# Altium schematic symbol library jlcpcb_2025_04_resistors_extended_0201.schlib: 1508 symbols (part 3 of 8) (continued)
## CR0201JH0474G
designator R?  Resistance: 470kΩ  (hidden comment: *)
Resistor, 470kΩ, ±5%, 50mW, 25V, SMD 0201; Manufacturer: Uniroyal; Manufacturer Part Number: CR0201JH0474G; Supplier 1: LCSC; Supplier Part Number 1: C3037237; JLCPCB Part Number: C3037237; Power Rating: 50mW; Category: Resistors; Package Size: 0201; JLCPCB Basic Part: Yes; Tolerance: ±5%; Voltage Rating: 25V; ComponentLink1Description: Datasheet; ComponentLink1URL: https://wmsc.lcsc.com/wmsc/upload/file/pdf/v2/lcsc/2207051802_LIZ-Elec-CR0201JH0474G_C3037237.pdf; ComponentLink2Description: JLCPCB Part URL; ComponentLink2URL: https://jlcpcb.com/partdetail/C3037237
pins: 1, 2
1 alternate drawing of the same symbol

## CRCW02011K00FNED
designator R?  Resistance: 1kΩ  (hidden comment: *)
Resistor, 1kΩ, ±1%, 50mW, ±200ppm/℃, -55℃~+155℃, SMD 0201; Manufacturer: Uniroyal; Manufacturer Part Number: CRCW02011K00FNED; Supplier 1: LCSC; Supplier Part Number 1: C3008826; JLCPCB Part Number: C3008826; Power Rating: 50mW; Category: Resistors; Package Size: 0201; JLCPCB Basic Part: Yes; Tolerance: ±1%; Temperature Coefficient: ±200ppm/℃; Temperature Rating: -55℃~+155℃; ComponentLink1Description: Datasheet; ComponentLink1URL: https://wmsc.lcsc.com/wmsc/upload/file/pdf/v2/lcsc/2205121200_Vishay-Intertech-CRCW02011K00FNED_C3008826.pdf; ComponentLink2Description: JLCPCB Part URL; ComponentLink2URL: https://jlcpcb.com/partdetail/C3008826
pins: 1, 2
1 alternate drawing of the same symbol

## CRCW02011K00JNED
designator R?  Resistance: 1kΩ  (hidden comment: *)
Resistor, 1kΩ, ±5%, 50mW, 30V, ±200ppm/℃, -55℃~+155℃, SMD 0201; Manufacturer: Uniroyal; Manufacturer Part Number: CRCW02011K00JNED; Supplier 1: LCSC; Supplier Part Number 1: C2073617; JLCPCB Part Number: C2073617; Power Rating: 50mW; Category: Resistors; Package Size: 0201; JLCPCB Basic Part: Yes; Tolerance: ±5%; Voltage Rating: 30V; Temperature Coefficient: ±200ppm/℃; Temperature Rating: -55℃~+155℃; ComponentLink1Description: Datasheet; ComponentLink1URL: https://wmsc.lcsc.com/wmsc/upload/file/pdf/v2/lcsc/2304140030_Vishay-Intertech-CRCW02011K00JNED_C2073617.pdf; ComponentLink2Description: JLCPCB Part URL; ComponentLink2URL: https://jlcpcb.com/partdetail/C2073617
pins: 1, 2
1 alternate drawing of the same symbol

## CRCW02011K96FNED
designator R?  Resistance: 1.96kΩ  (hidden comment: *)
Resistor, 1.96kΩ, ±1%, 50mW, 30V, ±200ppm/℃, -55℃~+155℃, SMD 0201; Manufacturer: Uniroyal; Manufacturer Part Number: CRCW02011K96FNED; Supplier 1: LCSC; Supplier Part Number 1: C2101526; JLCPCB Part Number: C2101526; Power Rating: 50mW; Category: Resistors; Package Size: 0201; JLCPCB Basic Part: Yes; Tolerance: ±1%; Voltage Rating: 30V; Temperature Coefficient: ±200ppm/℃; Temperature Rating: -55℃~+155℃; ComponentLink1Description: Datasheet; ComponentLink1URL: https://wmsc.lcsc.com/wmsc/upload/file/pdf/v2/lcsc/2304140030_Vishay-Intertech-CRCW02011K96FNED_C2101526.pdf; ComponentLink2Description: JLCPCB Part URL; ComponentLink2URL: https://jlcpcb.com/partdetail/C2101526
pins: 1, 2
1 alternate drawing of the same symbol

## CRCW02011M00FKED
designator R?  Resistance: 1MΩ  (hidden comment: *)
Resistor, 1MΩ, ±1%, 50mW, 30V, ±100ppm/℃, -55℃~+155℃, SMD 0201; Manufacturer: Uniroyal; Manufacturer Part Number: CRCW02011M00FKED; Supplier 1: LCSC; Supplier Part Number 1: C2653994; JLCPCB Part Number: C2653994; Power Rating: 50mW; Category: Resistors; Package Size: 0201; JLCPCB Basic Part: Yes; Tolerance: ±1%; Voltage Rating: 30V; Temperature Coefficient: ±100ppm/℃; Temperature Rating: -55℃~+155℃; ComponentLink1Description: Datasheet; ComponentLink1URL: https://wmsc.lcsc.com/wmsc/upload/file/pdf/v2/lcsc/2304140030_Vishay-Intertech-CRCW02011M00FKED_C2653994.pdf; ComponentLink2Description: JLCPCB Part URL; ComponentLink2URL: https://jlcpcb.com/partdetail/C2653994
pins: 1, 2
1 alternate drawing of the same symbol

## CRCW02014K70FKED
designator R?  Resistance: 4.7kΩ  (hidden comment: *)
Resistor, 4.7kΩ, ±1%, 50mW, ±100ppm/℃, -55℃~+155℃, SMD 0201; Manufacturer: Uniroyal; Manufacturer Part Number: CRCW02014K70FKED; Supplier 1: LCSC; Supplier Part Number 1: C3000902; JLCPCB Part Number: C3000902; Power Rating: 50mW; Category: Resistors; Package Size: 0201; JLCPCB Basic Part: Yes; Tolerance: ±1%; Temperature Coefficient: ±100ppm/℃; Temperature Rating: -55℃~+155℃; ComponentLink1Description: Datasheet; ComponentLink1URL: https://wmsc.lcsc.com/wmsc/upload/file/pdf/v2/lcsc/2204251600_Vishay-Intertech-CRCW02014K70FKED_C3000902.pdf; ComponentLink2Description: JLCPCB Part URL; ComponentLink2URL: https://jlcpcb.com/partdetail/C3000902
pins: 1, 2
1 alternate drawing of the same symbol

## CRCW02014K70JNED
designator R?  Resistance: 4.7kΩ  (hidden comment: *)
Resistor, 4.7kΩ, ±5%, 50mW, 30V, ±200ppm/℃, -55℃~+155℃, SMD 0201; Manufacturer: Uniroyal; Manufacturer Part Number: CRCW02014K70JNED; Supplier 1: LCSC; Supplier Part Number 1: C2073629; JLCPCB Part Number: C2073629; Power Rating: 50mW; Category: Resistors; Package Size: 0201; JLCPCB Basic Part: Yes; Tolerance: ±5%; Voltage Rating: 30V; Temperature Coefficient: ±200ppm/℃; Temperature Rating: -55℃~+155℃; ComponentLink1Description: Datasheet; ComponentLink1URL: https://wmsc.lcsc.com/wmsc/upload/file/pdf/v2/lcsc/2304140030_Vishay-Intertech-CRCW02014K70JNED_C2073629.pdf; ComponentLink2Description: JLCPCB Part URL; ComponentLink2URL: https://jlcpcb.com/partdetail/C2073629
pins: 1, 2
1 alternate drawing of the same symbol

## CRCW02014K75FKED
designator R?  Resistance: 4.75kΩ  (hidden comment: *)
Resistor, 4.75kΩ, ±1%, 50mW, 30V, ±100ppm/℃, -55℃~+155℃, SMD 0201; Manufacturer: Uniroyal; Manufacturer Part Number: CRCW02014K75FKED; Supplier 1: LCSC; Supplier Part Number 1: C2073808; JLCPCB Part Number: C2073808; Power Rating: 50mW; Category: Resistors; Package Size: 0201; JLCPCB Basic Part: Yes; Tolerance: ±1%; Voltage Rating: 30V; Temperature Coefficient: ±100ppm/℃; Temperature Rating: -55℃~+155℃; ComponentLink1Description: Datasheet; ComponentLink1URL: https://wmsc.lcsc.com/wmsc/upload/file/pdf/v2/lcsc/2304140030_Vishay-Intertech-CRCW02014K75FKED_C2073808.pdf; ComponentLink2Description: JLCPCB Part URL; ComponentLink2URL: https://jlcpcb.com/partdetail/C2073808
pins: 1, 2
1 alternate drawing of the same symbol

## CRCW02014K99FKED
designator R?  Resistance: 4.99kΩ  (hidden comment: *)
Resistor, 4.99kΩ, ±1%, 50mW, 30V, ±100ppm/K, -55℃~+155℃, SMD 0201; Manufacturer: Uniroyal; Manufacturer Part Number: CRCW02014K99FKED; Supplier 1: LCSC; Supplier Part Number 1: C2653997; JLCPCB Part Number: C2653997; Power Rating: 50mW; Category: Resistors; Package Size: 0201; JLCPCB Basic Part: Yes; Tolerance: ±1%; Voltage Rating: 30V; Temperature Coefficient: ±100ppm/K; Temperature Rating: -55℃~+155℃; ComponentLink1Description: Datasheet; ComponentLink1URL: https://wmsc.lcsc.com/wmsc/upload/file/pdf/v2/lcsc/2304140030_Vishay-Intertech-CRCW02014K99FKED_C2653997.pdf; ComponentLink2Description: JLCPCB Part URL; ComponentLink2URL: https://jlcpcb.com/partdetail/C2653997
pins: 1, 2
1 alternate drawing of the same symbol

## CRCW02016K80FKED
designator R?  Resistance: 6.8kΩ  (hidden comment: *)
Resistor, 6.8kΩ, ±1%, 50mW, ±100ppm/℃, -55℃~+155℃, SMD 0201; Manufacturer: Uniroyal; Manufacturer Part Number: CRCW02016K80FKED; Supplier 1: LCSC; Supplier Part Number 1: C4056810; JLCPCB Part Number: C4056810; Power Rating: 50mW; Category: Resistors; Package Size: 0201; JLCPCB Basic Part: Yes; Tolerance: ±1%; Temperature Coefficient: ±100ppm/℃; Temperature Rating: -55℃~+155℃; ComponentLink1Description: Datasheet; ComponentLink1URL: https://wmsc.lcsc.com/wmsc/upload/file/pdf/v2/lcsc/2312130943_Vishay-Intertech-CRCW02016K80FKED_C4056810.pdf; ComponentLink2Description: JLCPCB Part URL; ComponentLink2URL: https://jlcpcb.com/partdetail/C4056810
pins: 1, 2
1 alternate drawing of the same symbol

## CRCW02018M06FNED
designator R?  Resistance: 8.06MΩ  (hidden comment: *)
Resistor, 8.06MΩ, ±1%, 50mW, ±200ppm/℃, -55℃~+155℃, SMD 0201; Manufacturer: Uniroyal; Manufacturer Part Number: CRCW02018M06FNED; Supplier 1: LCSC; Supplier Part Number 1: C4346318; JLCPCB Part Number: C4346318; Power Rating: 50mW; Category: Resistors; Package Size: 0201; JLCPCB Basic Part: Yes; Tolerance: ±1%; Temperature Coefficient: ±200ppm/℃; Temperature Rating: -55℃~+155℃; ComponentLink1Description: Datasheet; ComponentLink1URL: https://wmsc.lcsc.com/wmsc/upload/file/pdf/v2/lcsc/2212211230_Vishay-Intertech-CRCW02018M06FNED_C4346318.pdf; ComponentLink2Description: JLCPCB Part URL; ComponentLink2URL: https://jlcpcb.com/partdetail/C4346318
pins: 1, 2
1 alternate drawing of the same symbol

## CRCW020110R0FNED
designator R?  Resistance: 10Ω  (hidden comment: *)
Resistor, 10Ω, ±1%, 50mW, 30V, ±200ppm/℃, -55℃~+155℃, SMD 0201; Manufacturer: Uniroyal; Manufacturer Part Number: CRCW020110R0FNED; Supplier 1: LCSC; Supplier Part Number 1: C2092258; JLCPCB Part Number: C2092258; Power Rating: 50mW; Category: Resistors; Package Size: 0201; JLCPCB Basic Part: Yes; Tolerance: ±1%; Voltage Rating: 30V; Temperature Coefficient: ±200ppm/℃; Temperature Rating: -55℃~+155℃; ComponentLink1Description: Datasheet; ComponentLink1URL: https://wmsc.lcsc.com/wmsc/upload/file/pdf/v2/lcsc/2304140030_Vishay-Intertech-CRCW020110R0FNED_C2092258.pdf; ComponentLink2Description: JLCPCB Part URL; ComponentLink2URL: https://jlcpcb.com/partdetail/C2092258
pins: 1, 2
1 alternate drawing of the same symbol

## CRCW020110R0JNED
designator R?  Resistance: 10Ω  (hidden comment: *)
Resistor, 10Ω, ±5%, 50mW, ±200ppm/℃, -55℃~+155℃, SMD 0201; Manufacturer: Uniroyal; Manufacturer Part Number: CRCW020110R0JNED; Supplier 1: LCSC; Supplier Part Number 1: C4050067; JLCPCB Part Number: C4050067; Power Rating: 50mW; Category: Resistors; Package Size: 0201; JLCPCB Basic Part: Yes; Tolerance: ±5%; Temperature Coefficient: ±200ppm/℃; Temperature Rating: -55℃~+155℃; ComponentLink1Description: Datasheet; ComponentLink1URL: https://wmsc.lcsc.com/wmsc/upload/file/pdf/v2/lcsc/2312181408_Vishay-Intertech-CRCW020110R0JNED_C4050067.pdf; ComponentLink2Description: JLCPCB Part URL; ComponentLink2URL: https://jlcpcb.com/partdetail/C4050067
pins: 1, 2
1 alternate drawing of the same symbol

## CRCW020120K0FKED
designator R?  Resistance: 20kΩ  (hidden comment: *)
Resistor, 20kΩ, ±1%, 50mW, 30V, ±100ppm/℃, -55℃~+155℃, SMD 0201; Manufacturer: Uniroyal; Manufacturer Part Number: CRCW020120K0FKED; Supplier 1: LCSC; Supplier Part Number 1: C2653998; JLCPCB Part Number: C2653998; Power Rating: 50mW; Category: Resistors; Package Size: 0201; JLCPCB Basic Part: Yes; Tolerance: ±1%; Voltage Rating: 30V; Temperature Coefficient: ±100ppm/℃; Temperature Rating: -55℃~+155℃; ComponentLink1Description: Datasheet; ComponentLink1URL: https://wmsc.lcsc.com/wmsc/upload/file/pdf/v2/lcsc/2304140030_Vishay-Intertech-CRCW020120K0FKED_C2653998.pdf; ComponentLink2Description: JLCPCB Part URL; ComponentLink2URL: https://jlcpcb.com/partdetail/C2653998
pins: 1, 2
1 alternate drawing of the same symbol

## CRCW020120R0FNED
designator R?  Resistance: 20Ω  (hidden comment: *)
Resistor, 20Ω, ±1%, 50mW, ±200ppm/℃, -55℃~+155℃, SMD 0201; Manufacturer: Uniroyal; Manufacturer Part Number: CRCW020120R0FNED; Supplier 1: LCSC; Supplier Part Number 1: C3951712; JLCPCB Part Number: C3951712; Power Rating: 50mW; Category: Resistors; Package Size: 0201; JLCPCB Basic Part: Yes; Tolerance: ±1%; Temperature Coefficient: ±200ppm/℃; Temperature Rating: -55℃~+155℃; ComponentLink1Description: Datasheet; ComponentLink1URL: https://wmsc.lcsc.com/wmsc/upload/file/pdf/v2/lcsc/2312121724_Vishay-Intertech-CRCW020120R0FNED_C3951712.pdf; ComponentLink2Description: JLCPCB Part URL; ComponentLink2URL: https://jlcpcb.com/partdetail/C3951712
pins: 1, 2
1 alternate drawing of the same symbol

## CRCW020122R0FNED
designator R?  Resistance: 22Ω  (hidden comment: *)
Resistor, 22Ω, ±1%, 50mW, 30V, ±200ppm/K, -55℃~+155℃, SMD 0201; Manufacturer: Uniroyal; Manufacturer Part Number: CRCW020122R0FNED; Supplier 1: LCSC; Supplier Part Number 1: C2073838; JLCPCB Part Number: C2073838; Power Rating: 50mW; Category: Resistors; Package Size: 0201; JLCPCB Basic Part: Yes; Tolerance: ±1%; Voltage Rating: 30V; Temperature Coefficient: ±200ppm/K; Temperature Rating: -55℃~+155℃; ComponentLink1Description: Datasheet; ComponentLink1URL: https://wmsc.lcsc.com/wmsc/upload/file/pdf/v2/lcsc/2304140030_Vishay-Intertech-CRCW020122R0FNED_C2073838.pdf; ComponentLink2Description: JLCPCB Part URL; ComponentLink2URL: https://jlcpcb.com/partdetail/C2073838
pins: 1, 2
1 alternate drawing of the same symbol

## CRCW020133R2FNED
designator R?  Resistance: 33.2Ω  (hidden comment: *)
Resistor, 33.2Ω, ±1%, 50mW, 30V, ±200ppm/K, -55℃~+155℃, SMD 0201; Manufacturer: Uniroyal; Manufacturer Part Number: CRCW020133R2FNED; Supplier 1: LCSC; Supplier Part Number 1: C2073786; JLCPCB Part Number: C2073786; Power Rating: 50mW; Category: Resistors; Package Size: 0201; JLCPCB Basic Part: Yes; Tolerance: ±1%; Voltage Rating: 30V; Temperature Coefficient: ±200ppm/K; Temperature Rating: -55℃~+155℃; ComponentLink1Description: Datasheet; ComponentLink1URL: https://wmsc.lcsc.com/wmsc/upload/file/pdf/v2/lcsc/2304140030_Vishay-Intertech-CRCW020133R2FNED_C2073786.pdf; ComponentLink2Description: JLCPCB Part URL; ComponentLink2URL: https://jlcpcb.com/partdetail/C2073786
pins: 1, 2
1 alternate drawing of the same symbol

## CRCW020149K9FKED
designator R?  Resistance: 49.9kΩ  (hidden comment: *)
Resistor, 49.9kΩ, ±1%, 50mW, 30V, ±100ppm/℃, -55℃~+155℃, SMD 0201; Manufacturer: Uniroyal; Manufacturer Part Number: CRCW020149K9FKED; Supplier 1: LCSC; Supplier Part Number 1: C2074396; JLCPCB Part Number: C2074396; Power Rating: 50mW; Category: Resistors; Package Size: 0201; JLCPCB Basic Part: Yes; Tolerance: ±1%; Voltage Rating: 30V; Temperature Coefficient: ±100ppm/℃; Temperature Rating: -55℃~+155℃; ComponentLink1Description: Datasheet; ComponentLink1URL: https://wmsc.lcsc.com/wmsc/upload/file/pdf/v2/lcsc/2304140030_Vishay-Intertech-CRCW020149K9FKED_C2074396.pdf; ComponentLink2Description: JLCPCB Part URL; ComponentLink2URL: https://jlcpcb.com/partdetail/C2074396
pins: 1, 2
1 alternate drawing of the same symbol

## CRCW020149K9FNED
designator R?  Resistance: 49.9kΩ  (hidden comment: *)
Resistor, 49.9kΩ, ±1%, 50mW, 30V, ±200ppm/℃, -55℃~+155℃, SMD 0201; Manufacturer: Uniroyal; Manufacturer Part Number: CRCW020149K9FNED; Supplier 1: LCSC; Supplier Part Number 1: C2073770; JLCPCB Part Number: C2073770; Power Rating: 50mW; Category: Resistors; Package Size: 0201; JLCPCB Basic Part: Yes; Tolerance: ±1%; Voltage Rating: 30V; Temperature Coefficient: ±200ppm/℃; Temperature Rating: -55℃~+155℃; ComponentLink1Description: Datasheet; ComponentLink1URL: https://wmsc.lcsc.com/wmsc/upload/file/pdf/v2/lcsc/2304140030_Vishay-Intertech-CRCW020149K9FNED_C2073770.pdf; ComponentLink2Description: JLCPCB Part URL; ComponentLink2URL: https://jlcpcb.com/partdetail/C2073770
pins: 1, 2
1 alternate drawing of the same symbol

## CRCW020149R9FNED
designator R?  Resistance: 49.9Ω  (hidden comment: *)
Resistor, 49.9Ω, ±1%, 50mW, 30V, ±200ppm/℃, -55℃~+155℃, SMD 0201; Manufacturer: Uniroyal; Manufacturer Part Number: CRCW020149R9FNED; Supplier 1: LCSC; Supplier Part Number 1: C2073797; JLCPCB Part Number: C2073797; Power Rating: 50mW; Category: Resistors; Package Size: 0201; JLCPCB Basic Part: Yes; Tolerance: ±1%; Voltage Rating: 30V; Temperature Coefficient: ±200ppm/℃; Temperature Rating: -55℃~+155℃; ComponentLink1Description: Datasheet; ComponentLink1URL: https://wmsc.lcsc.com/wmsc/upload/file/pdf/v2/lcsc/2304140030_Vishay-Intertech-CRCW020149R9FNED_C2073797.pdf; ComponentLink2Description: JLCPCB Part URL; ComponentLink2URL: https://jlcpcb.com/partdetail/C2073797
pins: 1, 2
1 alternate drawing of the same symbol

## CRCW020162K0FNED
designator R?  Resistance: 62kΩ  (hidden comment: *)
Resistor, 62kΩ, ±1%, 50mW, ±200ppm/℃, -55℃~+155℃, SMD 0201; Manufacturer: Uniroyal; Manufacturer Part Number: CRCW020162K0FNED; Supplier 1: LCSC; Supplier Part Number 1: C4232560; JLCPCB Part Number: C4232560; Power Rating: 50mW; Category: Resistors; Package Size: 0201; JLCPCB Basic Part: Yes; Tolerance: ±1%; Temperature Coefficient: ±200ppm/℃; Temperature Rating: -55℃~+155℃; ComponentLink1Description: Datasheet; ComponentLink1URL: https://wmsc.lcsc.com/wmsc/upload/file/pdf/v2/lcsc/2312131110_Vishay-Intertech-CRCW020162K0FNED_C4232560.pdf; ComponentLink2Description: JLCPCB Part URL; ComponentLink2URL: https://jlcpcb.com/partdetail/C4232560
pins: 1, 2
1 alternate drawing of the same symbol

## CRCW0201100KFKED
designator R?  Resistance: 100kΩ  (hidden comment: *)
Resistor, 100kΩ, ±1%, 50mW, 30V, ±100ppm/K, -55℃~+155℃, SMD 0201; Manufacturer: Uniroyal; Manufacturer Part Number: CRCW0201100KFKED; Supplier 1: LCSC; Supplier Part Number 1: C843835; JLCPCB Part Number: C843835; Power Rating: 50mW; Category: Resistors; Package Size: 0201; JLCPCB Basic Part: Yes; Tolerance: ±1%; Voltage Rating: 30V; Temperature Coefficient: ±100ppm/K; Temperature Rating: -55℃~+155℃; ComponentLink1Description: Datasheet; ComponentLink1URL: https://wmsc.lcsc.com/wmsc/upload/file/pdf/v2/lcsc/2304140030_Vishay-Intertech-CRCW0201100KFKED_C843835.pdf; ComponentLink2Description: JLCPCB Part URL; ComponentLink2URL: https://jlcpcb.com/partdetail/C843835
pins: 1, 2
1 alternate drawing of the same symbol

## CRCW0201100RFNED
designator R?  Resistance: 100Ω  (hidden comment: *)
Resistor, 100Ω, ±1%, 50mW, 30V, ±200ppm/℃, -55℃~+155℃, SMD 0201; Manufacturer: Uniroyal; Manufacturer Part Number: CRCW0201100RFNED; Supplier 1: LCSC; Supplier Part Number 1: C2073844; JLCPCB Part Number: C2073844; Power Rating: 50mW; Category: Resistors; Package Size: 0201; JLCPCB Basic Part: Yes; Tolerance: ±1%; Voltage Rating: 30V; Temperature Coefficient: ±200ppm/℃; Temperature Rating: -55℃~+155℃; ComponentLink1Description: Datasheet; ComponentLink1URL: https://wmsc.lcsc.com/wmsc/upload/file/pdf/v2/lcsc/2304140030_Vishay-Intertech-CRCW0201100RFNED_C2073844.pdf; ComponentLink2Description: JLCPCB Part URL; ComponentLink2URL: https://jlcpcb.com/partdetail/C2073844
pins: 1, 2
1 alternate drawing of the same symbol

## CRCW0201150RFKED
designator R?  Resistance: 150Ω  (hidden comment: *)
Resistor, 150Ω, ±1%, 50mW, 30V, ±100ppm/℃, -55℃~+155℃, SMD 0201; Manufacturer: Uniroyal; Manufacturer Part Number: CRCW0201150RFKED; Supplier 1: LCSC; Supplier Part Number 1: C2074383; JLCPCB Part Number: C2074383; Power Rating: 50mW; Category: Resistors; Package Size: 0201; JLCPCB Basic Part: Yes; Tolerance: ±1%; Voltage Rating: 30V; Temperature Coefficient: ±100ppm/℃; Temperature Rating: -55℃~+155℃; ComponentLink1Description: Datasheet; ComponentLink1URL: https://wmsc.lcsc.com/wmsc/upload/file/pdf/v2/lcsc/2304140030_Vishay-Intertech-CRCW0201150RFKED_C2074383.pdf; ComponentLink2Description: JLCPCB Part URL; ComponentLink2URL: https://jlcpcb.com/partdetail/C2074383
pins: 1, 2
1 alternate drawing of the same symbol

## CRCW0201150RFNED
designator R?  Resistance: 150Ω  (hidden comment: *)
Resistor, 150Ω, ±1%, 50mW, 30V, ±200ppm/℃, -55℃~+155℃, SMD 0201; Manufacturer: Uniroyal; Manufacturer Part Number: CRCW0201150RFNED; Supplier 1: LCSC; Supplier Part Number 1: C2094996; JLCPCB Part Number: C2094996; Power Rating: 50mW; Category: Resistors; Package Size: 0201; JLCPCB Basic Part: Yes; Tolerance: ±1%; Voltage Rating: 30V; Temperature Coefficient: ±200ppm/℃; Temperature Rating: -55℃~+155℃; ComponentLink1Description: Datasheet; ComponentLink1URL: https://wmsc.lcsc.com/wmsc/upload/file/pdf/v2/lcsc/2304140030_Vishay-Intertech-CRCW0201150RFNED_C2094996.pdf; ComponentLink2Description: JLCPCB Part URL; ComponentLink2URL: https://jlcpcb.com/partdetail/C2094996
pins: 1, 2
1 alternate drawing of the same symbol

## CRCW02010000Z0ED
designator R?  Resistance: 0Ω  (hidden comment: *)
Resistor, 0Ω, 50mW, 30V, -55℃~+155℃, SMD 0201; Manufacturer: Uniroyal; Manufacturer Part Number: CRCW02010000Z0ED; Supplier 1: LCSC; Supplier Part Number 1: C844709; JLCPCB Part Number: C844709; Power Rating: 50mW; Category: Resistors; Package Size: 0201; JLCPCB Basic Part: Yes; Voltage Rating: 30V; Temperature Rating: -55℃~+155℃; ComponentLink1Description: Datasheet; ComponentLink1URL: https://wmsc.lcsc.com/wmsc/upload/file/pdf/v2/lcsc/2011261809_Vishay-Intertech-CRCW02010000Z0ED_C844709.pdf; ComponentLink2Description: JLCPCB Part URL; ComponentLink2URL: https://jlcpcb.com/partdetail/C844709
pins: 1, 2
1 alternate drawing of the same symbol

## ERA1AEB102C
designator R?  Resistance: 1kΩ  (hidden comment: *)
Resistor, 1kΩ, ±0.1%, 50mW, 25V, ±25ppm/℃, -55℃~+155℃, SMD 0201; Manufacturer: Uniroyal; Manufacturer Part Number: ERA1AEB102C; Supplier 1: LCSC; Supplier Part Number 1: C490807; JLCPCB Part Number: C490807; Power Rating: 50mW; Category: Resistors; Package Size: 0201; JLCPCB Basic Part: Yes; Tolerance: ±0.1%; Voltage Rating: 25V; Temperature Coefficient: ±25ppm/℃; Temperature Rating: -55℃~+155℃; ComponentLink1Description: Datasheet; ComponentLink1URL: https://wmsc.lcsc.com/wmsc/upload/file/pdf/v2/lcsc/2005291532_PANASONIC-ERA1AEB102C_C490807.pdf; ComponentLink2Description: JLCPCB Part URL; ComponentLink2URL: https://jlcpcb.com/partdetail/C490807
pins: 1, 2
1 alternate drawing of the same symbol

## ERA1AEB103C
designator R?  Resistance: 10kΩ  (hidden comment: *)
Resistor, 10kΩ, ±0.1%, 50mW, 25V, ±25ppm/K, -55℃~+155℃, SMD 0201; Manufacturer: Uniroyal; Manufacturer Part Number: ERA1AEB103C; Supplier 1: LCSC; Supplier Part Number 1: C490808; JLCPCB Part Number: C490808; Power Rating: 50mW; Category: Resistors; Package Size: 0201; JLCPCB Basic Part: Yes; Tolerance: ±0.1%; Voltage Rating: 25V; Temperature Coefficient: ±25ppm/K; Temperature Rating: -55℃~+155℃; ComponentLink1Description: Datasheet; ComponentLink1URL: https://wmsc.lcsc.com/wmsc/upload/file/pdf/v2/lcsc/2005291532_PANASONIC-ERA1AEB103C_C490808.pdf; ComponentLink2Description: JLCPCB Part URL; ComponentLink2URL: https://jlcpcb.com/partdetail/C490808
pins: 1, 2
1 alternate drawing of the same symbol

## ERA1AEB202C
designator R?  Resistance: 2kΩ  (hidden comment: *)
Resistor, 2kΩ, ±0.1%, 50mW, 25V, ±25ppm/℃, -55℃~+155℃, SMD 0201; Manufacturer: Uniroyal; Manufacturer Part Number: ERA1AEB202C; Supplier 1: LCSC; Supplier Part Number 1: C490810; JLCPCB Part Number: C490810; Power Rating: 50mW; Category: Resistors; Package Size: 0201; JLCPCB Basic Part: Yes; Tolerance: ±0.1%; Voltage Rating: 25V; Temperature Coefficient: ±25ppm/℃; Temperature Rating: -55℃~+155℃; ComponentLink1Description: Datasheet; ComponentLink1URL: https://wmsc.lcsc.com/wmsc/upload/file/pdf/v2/lcsc/2004071107_PANASONIC-ERA1AEB202C_C490810.pdf; ComponentLink2Description: JLCPCB Part URL; ComponentLink2URL: https://jlcpcb.com/partdetail/C490810
pins: 1, 2
1 alternate drawing of the same symbol

## ERJ1GN0R00C
designator R?  Resistance: 0Ω  (hidden comment: *)
Resistor, 0Ω, 50mW, -55℃~+125℃, SMD 0201; Manufacturer: Uniroyal; Manufacturer Part Number: ERJ1GN0R00C; Supplier 1: LCSC; Supplier Part Number 1: C716999; JLCPCB Part Number: C716999; Power Rating: 50mW; Category: Resistors; Package Size: 0201; JLCPCB Basic Part: Yes; Temperature Rating: -55℃~+125℃; ComponentLink1Description: Datasheet; ComponentLink1URL: https://wmsc.lcsc.com/wmsc/upload/file/pdf/v2/lcsc/2011031708_PANASONIC-ERJ1GN0R00C_C716999.pdf; ComponentLink2Description: JLCPCB Part URL; ComponentLink2URL: https://jlcpcb.com/partdetail/C716999
pins: 1, 2
1 alternate drawing of the same symbol

## ERJ1GNF22R0C
designator R?  Resistance: 22Ω  (hidden comment: *)
Resistor, 22Ω, ±1%, 50mW, ±200ppm/℃, -55℃~+125℃, SMD 0201; Manufacturer: Uniroyal; Manufacturer Part Number: ERJ1GNF22R0C; Supplier 1: LCSC; Supplier Part Number 1: C717006; JLCPCB Part Number: C717006; Power Rating: 50mW; Category: Resistors; Package Size: 0201; JLCPCB Basic Part: Yes; Tolerance: ±1%; Temperature Coefficient: ±200ppm/℃; Temperature Rating: -55℃~+125℃; ComponentLink1Description: Datasheet; ComponentLink1URL: https://wmsc.lcsc.com/wmsc/upload/file/pdf/v2/lcsc/2011261809_PANASONIC-ERJ1GNF22R0C_C717006.pdf; ComponentLink2Description: JLCPCB Part URL; ComponentLink2URL: https://jlcpcb.com/partdetail/C717006
pins: 1, 2
1 alternate drawing of the same symbol

## ERJ1GNF33R0C
designator R?  Resistance: 33Ω  (hidden comment: *)
Resistor, 33Ω, ±1%, 50mW, ±200ppm/℃, -55℃~+125℃, SMD 0201; Manufacturer: Uniroyal; Manufacturer Part Number: ERJ1GNF33R0C; Supplier 1: LCSC; Supplier Part Number 1: C717007; JLCPCB Part Number: C717007; Power Rating: 50mW; Category: Resistors; Package Size: 0201; JLCPCB Basic Part: Yes; Tolerance: ±1%; Temperature Coefficient: ±200ppm/℃; Temperature Rating: -55℃~+125℃; ComponentLink1Description: Datasheet; ComponentLink1URL: https://wmsc.lcsc.com/wmsc/upload/file/pdf/v2/lcsc/2011261809_PANASONIC-ERJ1GNF33R0C_C717007.pdf; ComponentLink2Description: JLCPCB Part URL; ComponentLink2URL: https://jlcpcb.com/partdetail/C717007
pins: 1, 2
1 alternate drawing of the same symbol

## ERJ1GNF1001C
designator R?  Resistance: 1kΩ  (hidden comment: *)
Resistor, 1kΩ, ±1%, 50mW, ±200ppm/℃, -55℃~+125℃, SMD 0201; Manufacturer: Uniroyal; Manufacturer Part Number: ERJ1GNF1001C; Supplier 1: LCSC; Supplier Part Number 1: C717001; JLCPCB Part Number: C717001; Power Rating: 50mW; Category: Resistors; Package Size: 0201; JLCPCB Basic Part: Yes; Tolerance: ±1%; Temperature Coefficient: ±200ppm/℃; Temperature Rating: -55℃~+125℃; ComponentLink1Description: Datasheet; ComponentLink1URL: https://wmsc.lcsc.com/wmsc/upload/file/pdf/v2/lcsc/2011261809_PANASONIC-ERJ1GNF1001C_C717001.pdf; ComponentLink2Description: JLCPCB Part URL; ComponentLink2URL: https://jlcpcb.com/partdetail/C717001
pins: 1, 2
1 alternate drawing of the same symbol

## ERJ1GNF2000C
designator R?  Resistance: 200Ω  (hidden comment: *)
Resistor, 200Ω, ±1%, 50mW, ±200ppm/℃, -55℃~+125℃, SMD 0201; Manufacturer: Uniroyal; Manufacturer Part Number: ERJ1GNF2000C; Supplier 1: LCSC; Supplier Part Number 1: C713489; JLCPCB Part Number: C713489; Power Rating: 50mW; Category: Resistors; Package Size: 0201; JLCPCB Basic Part: Yes; Tolerance: ±1%; Temperature Coefficient: ±200ppm/℃; Temperature Rating: -55℃~+125℃; ComponentLink1Description: Datasheet; ComponentLink1URL: https://wmsc.lcsc.com/wmsc/upload/file/pdf/v2/lcsc/2011261809_PANASONIC-ERJ1GNF2000C_C713489.pdf; ComponentLink2Description: JLCPCB Part URL; ComponentLink2URL: https://jlcpcb.com/partdetail/C713489
pins: 1, 2
1 alternate drawing of the same symbol

## ERJ1GNF3300C
designator R?  Resistance: 330Ω  (hidden comment: *)
Resistor, 330Ω, ±1%, 50mW, ±200ppm/℃, -55℃~+125℃, SMD 0201; Manufacturer: Uniroyal; Manufacturer Part Number: ERJ1GNF3300C; Supplier 1: LCSC; Supplier Part Number 1: C713496; JLCPCB Part Number: C713496; Power Rating: 50mW; Category: Resistors; Package Size: 0201; JLCPCB Basic Part: Yes; Tolerance: ±1%; Temperature Coefficient: ±200ppm/℃; Temperature Rating: -55℃~+125℃; ComponentLink1Description: Datasheet; ComponentLink1URL: https://wmsc.lcsc.com/wmsc/upload/file/pdf/v2/lcsc/2011261809_PANASONIC-ERJ1GNF3300C_C713496.pdf; ComponentLink2Description: JLCPCB Part URL; ComponentLink2URL: https://jlcpcb.com/partdetail/C713496
pins: 1, 2
1 alternate drawing of the same symbol

## ERJ1GNF4990C
designator R?  Resistance: 499Ω  (hidden comment: *)
Resistor, 499Ω, ±1%, 50mW, ±200ppm/℃, -55℃~+125℃, SMD 0201; Manufacturer: Uniroyal; Manufacturer Part Number: ERJ1GNF4990C; Supplier 1: LCSC; Supplier Part Number 1: C713497; JLCPCB Part Number: C713497; Power Rating: 50mW; Category: Resistors; Package Size: 0201; JLCPCB Basic Part: Yes; Tolerance: ±1%; Temperature Coefficient: ±200ppm/℃; Temperature Rating: -55℃~+125℃; ComponentLink1Description: Datasheet; ComponentLink1URL: https://wmsc.lcsc.com/wmsc/upload/file/pdf/v2/lcsc/2011261809_PANASONIC-ERJ1GNF4990C_C713497.pdf; ComponentLink2Description: JLCPCB Part URL; ComponentLink2URL: https://jlcpcb.com/partdetail/C713497
pins: 1, 2
1 alternate drawing of the same symbol

## ERJ1GNF4992C
designator R?  Resistance: 49.9kΩ  (hidden comment: *)
Resistor, 49.9kΩ, ±1%, 50mW, ±200ppm/℃, -55℃~+125℃, SMD 0201; Manufacturer: Uniroyal; Manufacturer Part Number: ERJ1GNF4992C; Supplier 1: LCSC; Supplier Part Number 1: C713498; JLCPCB Part Number: C713498; Power Rating: 50mW; Category: Resistors; Package Size: 0201; JLCPCB Basic Part: Yes; Tolerance: ±1%; Temperature Coefficient: ±200ppm/℃; Temperature Rating: -55℃~+125℃; ComponentLink1Description: Datasheet; ComponentLink1URL: https://wmsc.lcsc.com/wmsc/upload/file/pdf/v2/lcsc/2011261809_PANASONIC-ERJ1GNF4992C_C713498.pdf; ComponentLink2Description: JLCPCB Part URL; ComponentLink2URL: https://jlcpcb.com/partdetail/C713498
pins: 1, 2
1 alternate drawing of the same symbol

## ERJ1GNF6041C
designator R?  Resistance: 6.04kΩ  (hidden comment: *)
Resistor, 6.04kΩ, ±1%, 50mW, ±200ppm/℃, -55℃~+125℃, SMD 0201; Manufacturer: Uniroyal; Manufacturer Part Number: ERJ1GNF6041C; Supplier 1: LCSC; Supplier Part Number 1: C717010; JLCPCB Part Number: C717010; Power Rating: 50mW; Category: Resistors; Package Size: 0201; JLCPCB Basic Part: Yes; Tolerance: ±1%; Temperature Coefficient: ±200ppm/℃; Temperature Rating: -55℃~+125℃; ComponentLink1Description: Datasheet; ComponentLink1URL: https://wmsc.lcsc.com/wmsc/upload/file/pdf/v2/lcsc/2011031537_PANASONIC-ERJ1GNF6041C_C717010.pdf; ComponentLink2Description: JLCPCB Part URL; ComponentLink2URL: https://jlcpcb.com/partdetail/C717010
pins: 1, 2
1 alternate drawing of the same symbol

## ERJ1GNJ101C
designator R?  Resistance: 100Ω  (hidden comment: *)
Resistor, 100Ω, ±5%, 50mW, ±200ppm/℃, -55℃~+125℃, SMD 0201; Manufacturer: Uniroyal; Manufacturer Part Number: ERJ1GNJ101C; Supplier 1: LCSC; Supplier Part Number 1: C713500; JLCPCB Part Number: C713500; Power Rating: 50mW; Category: Resistors; Package Size: 0201; JLCPCB Basic Part: Yes; Tolerance: ±5%; Temperature Coefficient: ±200ppm/℃; Temperature Rating: -55℃~+125℃; ComponentLink1Description: Datasheet; ComponentLink1URL: https://wmsc.lcsc.com/wmsc/upload/file/pdf/v2/lcsc/2011031536_PANASONIC-ERJ1GNJ101C_C713500.pdf; ComponentLink2Description: JLCPCB Part URL; ComponentLink2URL: https://jlcpcb.com/partdetail/C713500
pins: 1, 2
1 alternate drawing of the same symbol

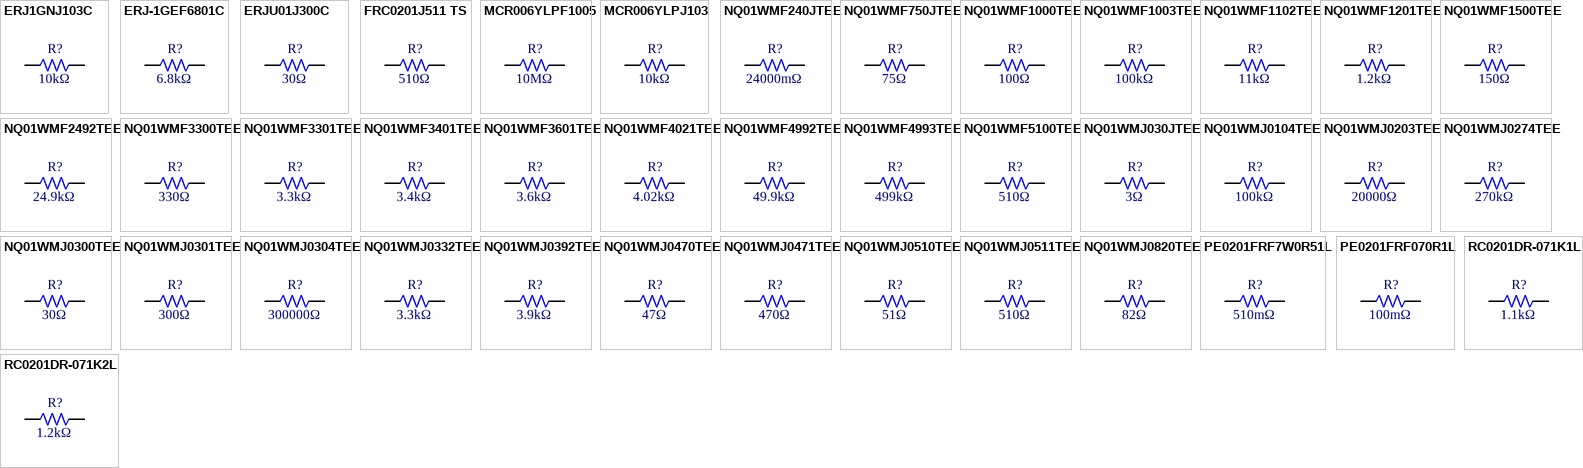
[diagram p13: symbols ERJ1GNJ103C to RC0201DR-071K2L]

## ERJ1GNJ103C
designator R?  Resistance: 10kΩ  (hidden comment: *)
Resistor, 10kΩ, ±5%, 50mW, ±200ppm/℃, -55℃~+125℃, SMD 0201; Manufacturer: Uniroyal; Manufacturer Part Number: ERJ1GNJ103C; Supplier 1: LCSC; Supplier Part Number 1: C242159; JLCPCB Part Number: C242159; Power Rating: 50mW; Category: Resistors; Package Size: 0201; JLCPCB Basic Part: Yes; Tolerance: ±5%; Temperature Coefficient: ±200ppm/℃; Temperature Rating: -55℃~+125℃; ComponentLink1Description: Datasheet; ComponentLink1URL: https://wmsc.lcsc.com/wmsc/upload/file/pdf/v2/lcsc/1810162322_PANASONIC-ERJ1GNJ103C_C242159.pdf; ComponentLink2Description: JLCPCB Part URL; ComponentLink2URL: https://jlcpcb.com/partdetail/C242159
pins: 1, 2
1 alternate drawing of the same symbol

## ERJ-1GEF6801C
designator R?  Resistance: 6.8kΩ  (hidden comment: *)
Resistor, 6.8kΩ, ±1%, 50mW, ±200ppm/℃, -55℃~+125℃, SMD 0201; Manufacturer: Uniroyal; Manufacturer Part Number: ERJ-1GEF6801C; Supplier 1: LCSC; Supplier Part Number 1: C2092078; JLCPCB Part Number: C2092078; Power Rating: 50mW; Category: Resistors; Package Size: 0201; JLCPCB Basic Part: Yes; Tolerance: ±1%; Temperature Coefficient: ±200ppm/℃; Temperature Rating: -55℃~+125℃; ComponentLink1Description: Datasheet; ComponentLink1URL: https://wmsc.lcsc.com/wmsc/upload/file/pdf/v2/lcsc/2108042030_PANASONIC-ERJ-1GEF6801C_C2092078.pdf; ComponentLink2Description: JLCPCB Part URL; ComponentLink2URL: https://jlcpcb.com/partdetail/C2092078
pins: 1, 2
1 alternate drawing of the same symbol

## ERJU01J300C
designator R?  Resistance: 30Ω  (hidden comment: *)
Resistor, 30Ω, ±5%, 50mW, 50V, ±200ppm/℃, -55℃~+125℃, SMD 0201; Manufacturer: Uniroyal; Manufacturer Part Number: ERJU01J300C; Supplier 1: LCSC; Supplier Part Number 1: C491227; JLCPCB Part Number: C491227; Power Rating: 50mW; Category: Resistors; Package Size: 0201; JLCPCB Basic Part: Yes; Tolerance: ±5%; Voltage Rating: 50V; Temperature Coefficient: ±200ppm/℃; Temperature Rating: -55℃~+125℃; ComponentLink1Description: Datasheet; ComponentLink1URL: https://wmsc.lcsc.com/wmsc/upload/file/pdf/v2/lcsc/2005181233_PANASONIC-ERJU01J300C_C491227.pdf; ComponentLink2Description: JLCPCB Part URL; ComponentLink2URL: https://jlcpcb.com/partdetail/C491227
pins: 1, 2
1 alternate drawing of the same symbol

## FRC0201J511 TS
designator R?  Resistance: 510Ω  (hidden comment: *)
Resistor, 510Ω, ±5%, 50mW, SMD 0201; Manufacturer: Uniroyal; Manufacturer Part Number: FRC0201J511 TS; Supplier 1: LCSC; Supplier Part Number 1: C18164337; JLCPCB Part Number: C18164337; Power Rating: 50mW; Category: Resistors; Package Size: 0201; JLCPCB Basic Part: Yes; Tolerance: ±5%; ComponentLink1Description: Datasheet; ComponentLink1URL: https://wmsc.lcsc.com/wmsc/upload/file/pdf/v2/lcsc/2309141018_FOJAN-FRC0201J511-TS_C18164337.pdf; ComponentLink2Description: JLCPCB Part URL; ComponentLink2URL: https://jlcpcb.com/partdetail/C18164337
pins: 1, 2
1 alternate drawing of the same symbol

## MCR006YLPF1005
designator R?  Resistance: 10MΩ  (hidden comment: *)
Resistor, 10MΩ, ±1%, 50mW, 25V, ±250ppm/℃, -55℃~+125℃, SMD 0201; Manufacturer: Uniroyal; Manufacturer Part Number: MCR006YLPF1005; Supplier 1: LCSC; Supplier Part Number 1: C509702; JLCPCB Part Number: C509702; Power Rating: 50mW; Category: Resistors; Package Size: 0201; JLCPCB Basic Part: Yes; Tolerance: ±1%; Voltage Rating: 25V; Temperature Coefficient: ±250ppm/℃; Temperature Rating: -55℃~+125℃; ComponentLink1Description: Datasheet; ComponentLink1URL: https://wmsc.lcsc.com/wmsc/upload/file/pdf/v2/lcsc/2004232132_ROHM-Semicon-MCR006YLPF1005_C509702.pdf; ComponentLink2Description: JLCPCB Part URL; ComponentLink2URL: https://jlcpcb.com/partdetail/C509702
pins: 1, 2
1 alternate drawing of the same symbol

## MCR006YLPJ103
designator R?  Resistance: 10kΩ  (hidden comment: *)
Resistor, 10kΩ, ±5%, 50mW, 25V, ±250ppm/℃, -55℃~+125℃, SMD 0201; Manufacturer: Uniroyal; Manufacturer Part Number: MCR006YLPJ103; Supplier 1: LCSC; Supplier Part Number 1: C253350; JLCPCB Part Number: C253350; Power Rating: 50mW; Category: Resistors; Package Size: 0201; JLCPCB Basic Part: Yes; Tolerance: ±5%; Voltage Rating: 25V; Temperature Coefficient: ±250ppm/℃; Temperature Rating: -55℃~+125℃; ComponentLink1Description: Datasheet; ComponentLink1URL: https://wmsc.lcsc.com/wmsc/upload/file/pdf/v2/lcsc/2304140030_ROHM-Semicon-MCR006YLPJ103_C253350.pdf; ComponentLink2Description: JLCPCB Part URL; ComponentLink2URL: https://jlcpcb.com/partdetail/C253350
pins: 1, 2
1 alternate drawing of the same symbol

## NQ01WMF240JTEE
designator R?  Resistance: 24000mΩ  (hidden comment: *)
Resistor, 24000mΩ, ±1%, 50mW, 50V, ±200ppm/℃, -55℃~+155℃, SMD 0201; Manufacturer: Uniroyal; Manufacturer Part Number: NQ01WMF240JTEE; Supplier 1: LCSC; Supplier Part Number 1: C965380; JLCPCB Part Number: C965380; Power Rating: 50mW; Category: Resistors; Package Size: 0201; JLCPCB Basic Part: Yes; Tolerance: ±1%; Voltage Rating: 50V; Temperature Coefficient: ±200ppm/℃; Temperature Rating: -55℃~+155℃; ComponentLink1Description: Datasheet; ComponentLink1URL: https://wmsc.lcsc.com/wmsc/upload/file/pdf/v2/lcsc/2304140030_UNI-ROYAL-Uniroyal-Elec-NQ01WMF240JTEE_C965380.pdf; ComponentLink2Description: JLCPCB Part URL; ComponentLink2URL: https://jlcpcb.com/partdetail/C965380
pins: 1, 2
1 alternate drawing of the same symbol

## NQ01WMF750JTEE
designator R?  Resistance: 75Ω  (hidden comment: *)
Resistor, 75Ω, ±1%, 50mW, ±200ppm/℃, SMD 0201; Manufacturer: Uniroyal; Manufacturer Part Number: NQ01WMF750JTEE; Supplier 1: LCSC; Supplier Part Number 1: C965351; JLCPCB Part Number: C965351; Power Rating: 50mW; Category: Resistors; Package Size: 0201; JLCPCB Basic Part: Yes; Tolerance: ±1%; Temperature Coefficient: ±200ppm/℃; ComponentLink1Description: Datasheet; ComponentLink1URL: https://wmsc.lcsc.com/wmsc/upload/file/pdf/v2/lcsc/2304140030_UNI-ROYAL-Uniroyal-Elec-NQ01WMF750JTEE_C965351.pdf; ComponentLink2Description: JLCPCB Part URL; ComponentLink2URL: https://jlcpcb.com/partdetail/C965351
pins: 1, 2
1 alternate drawing of the same symbol

## NQ01WMF1000TEE
designator R?  Resistance: 100Ω  (hidden comment: *)
Resistor, 100Ω, ±1%, 50mW, 50V, ±200ppm/℃, -55℃~+155℃, SMD 0201; Manufacturer: Uniroyal; Manufacturer Part Number: NQ01WMF1000TEE; Supplier 1: LCSC; Supplier Part Number 1: C965400; JLCPCB Part Number: C965400; Power Rating: 50mW; Category: Resistors; Package Size: 0201; JLCPCB Basic Part: Yes; Tolerance: ±1%; Voltage Rating: 50V; Temperature Coefficient: ±200ppm/℃; Temperature Rating: -55℃~+155℃; ComponentLink1Description: Datasheet; ComponentLink1URL: https://wmsc.lcsc.com/wmsc/upload/file/pdf/v2/lcsc/2304140030_UNI-ROYAL-Uniroyal-Elec-NQ01WMF1000TEE_C965400.pdf; ComponentLink2Description: JLCPCB Part URL; ComponentLink2URL: https://jlcpcb.com/partdetail/C965400
pins: 1, 2
1 alternate drawing of the same symbol

## NQ01WMF1003TEE
designator R?  Resistance: 100kΩ  (hidden comment: *)
Resistor, 100kΩ, ±1%, 50mW, 50V, -55℃~+155℃, SMD 0201; Manufacturer: Uniroyal; Manufacturer Part Number: NQ01WMF1003TEE; Supplier 1: LCSC; Supplier Part Number 1: C2758767; JLCPCB Part Number: C2758767; Power Rating: 50mW; Category: Resistors; Package Size: 0201; JLCPCB Basic Part: Yes; Tolerance: ±1%; Voltage Rating: 50V; Temperature Rating: -55℃~+155℃; ComponentLink1Description: Datasheet; ComponentLink1URL: https://wmsc.lcsc.com/wmsc/upload/file/pdf/v2/lcsc/2103301736_UNI-ROYAL-Uniroyal-Elec-NQ01WMF1003TEE_C2758767.pdf; ComponentLink2Description: JLCPCB Part URL; ComponentLink2URL: https://jlcpcb.com/partdetail/C2758767
pins: 1, 2
1 alternate drawing of the same symbol

## NQ01WMF1102TEE
designator R?  Resistance: 11kΩ  (hidden comment: *)
Resistor, 11kΩ, ±1%, 50mW, ±200ppm/℃, SMD 0201; Manufacturer: Uniroyal; Manufacturer Part Number: NQ01WMF1102TEE; Supplier 1: LCSC; Supplier Part Number 1: C965397; JLCPCB Part Number: C965397; Power Rating: 50mW; Category: Resistors; Package Size: 0201; JLCPCB Basic Part: Yes; Tolerance: ±1%; Temperature Coefficient: ±200ppm/℃; ComponentLink1Description: Datasheet; ComponentLink1URL: https://wmsc.lcsc.com/wmsc/upload/file/pdf/v2/lcsc/2304140030_UNI-ROYAL-Uniroyal-Elec-NQ01WMF1102TEE_C965397.pdf; ComponentLink2Description: JLCPCB Part URL; ComponentLink2URL: https://jlcpcb.com/partdetail/C965397
pins: 1, 2
1 alternate drawing of the same symbol

## NQ01WMF1201TEE
designator R?  Resistance: 1.2kΩ  (hidden comment: *)
Resistor, 1.2kΩ, ±1%, 50mW, ±200ppm/℃, SMD 0201; Manufacturer: Uniroyal; Manufacturer Part Number: NQ01WMF1201TEE; Supplier 1: LCSC; Supplier Part Number 1: C965396; JLCPCB Part Number: C965396; Power Rating: 50mW; Category: Resistors; Package Size: 0201; JLCPCB Basic Part: Yes; Tolerance: ±1%; Temperature Coefficient: ±200ppm/℃; ComponentLink1Description: Datasheet; ComponentLink1URL: https://wmsc.lcsc.com/wmsc/upload/file/pdf/v2/lcsc/2304140030_UNI-ROYAL-Uniroyal-Elec-NQ01WMF1201TEE_C965396.pdf; ComponentLink2Description: JLCPCB Part URL; ComponentLink2URL: https://jlcpcb.com/partdetail/C965396
pins: 1, 2
1 alternate drawing of the same symbol

## NQ01WMF1500TEE
designator R?  Resistance: 150Ω  (hidden comment: *)
Resistor, 150Ω, ±1%, 50mW, ±200ppm/℃, SMD 0201; Manufacturer: Uniroyal; Manufacturer Part Number: NQ01WMF1500TEE; Supplier 1: LCSC; Supplier Part Number 1: C965392; JLCPCB Part Number: C965392; Power Rating: 50mW; Category: Resistors; Package Size: 0201; JLCPCB Basic Part: Yes; Tolerance: ±1%; Temperature Coefficient: ±200ppm/℃; ComponentLink1Description: Datasheet; ComponentLink1URL: https://wmsc.lcsc.com/wmsc/upload/file/pdf/v2/lcsc/2304140030_UNI-ROYAL-Uniroyal-Elec-NQ01WMF1500TEE_C965392.pdf; ComponentLink2Description: JLCPCB Part URL; ComponentLink2URL: https://jlcpcb.com/partdetail/C965392
pins: 1, 2
1 alternate drawing of the same symbol

## NQ01WMF2492TEE
designator R?  Resistance: 24.9kΩ  (hidden comment: *)
Resistor, 24.9kΩ, ±1%, 50mW, ±200ppm/℃, SMD 0201; Manufacturer: Uniroyal; Manufacturer Part Number: NQ01WMF2492TEE; Supplier 1: LCSC; Supplier Part Number 1: C965379; JLCPCB Part Number: C965379; Power Rating: 50mW; Category: Resistors; Package Size: 0201; JLCPCB Basic Part: Yes; Tolerance: ±1%; Temperature Coefficient: ±200ppm/℃; ComponentLink1Description: Datasheet; ComponentLink1URL: https://wmsc.lcsc.com/wmsc/upload/file/pdf/v2/lcsc/2304140030_UNI-ROYAL-Uniroyal-Elec-NQ01WMF2492TEE_C965379.pdf; ComponentLink2Description: JLCPCB Part URL; ComponentLink2URL: https://jlcpcb.com/partdetail/C965379
pins: 1, 2
1 alternate drawing of the same symbol
